# Altium integrated library RL2.IntLib: 663 symbols (part 3 of 4)
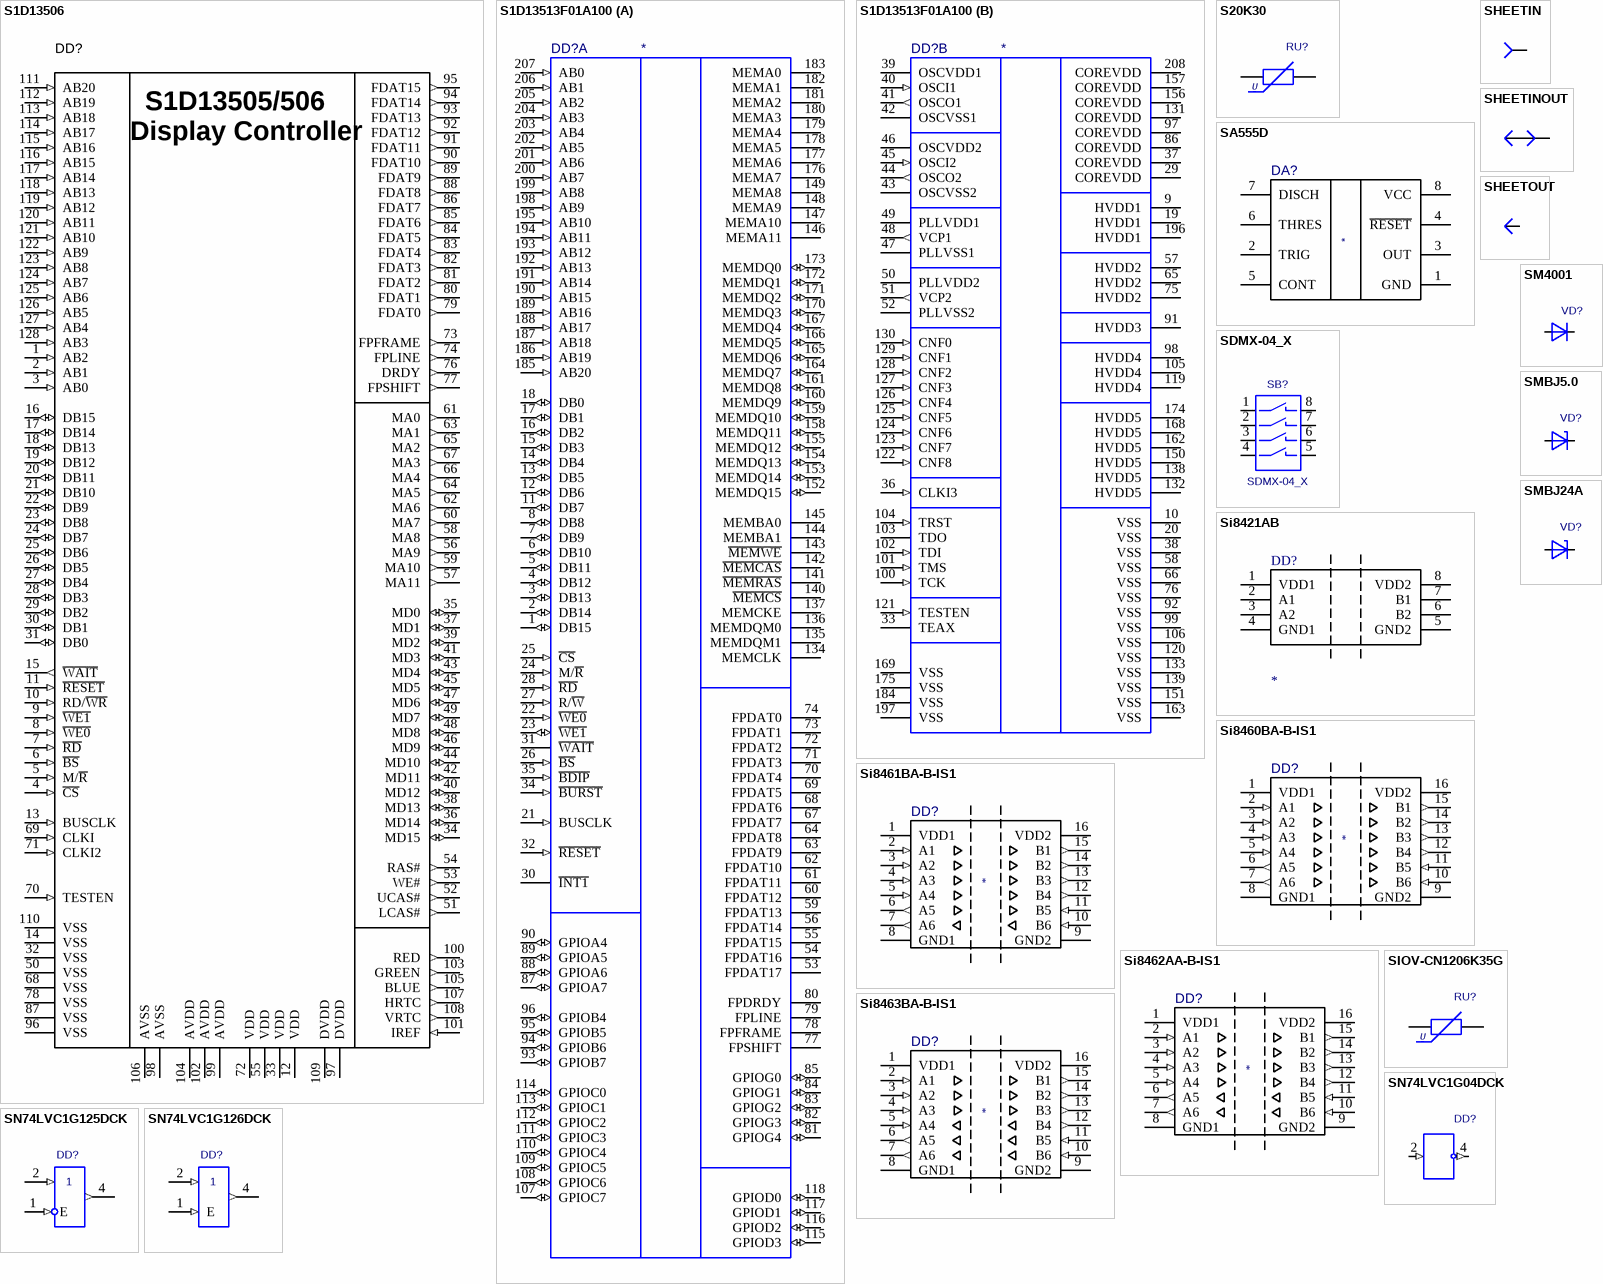
[diagram p36: symbols S1D13506 to SN74LVC1G126DCK]

## SIOV-CN1206K35G
designator RU?  (value not drawn)
SIOV-CN1206K35G; Value: {Value}
footprint SMD_1206
pins: 1, 2
text: U

## SM4001
designator VD?  (value not drawn)
SM4001; Value: *
footprint DO-213AB
pins: 1, 2

## SMBJ5.0
designator VD?  (value not drawn)
Value: *
footprint SMB
pins: 1, 2

## SMBJ24A
designator VD?, comment SMBJ5.0  (value not drawn)
Value: *
footprint SMB
pins: 1, 2

## SN74LVC1G04DCK
designator DD?  (value not drawn)
SN74LVC1G04DCK; Value: *
footprint SC-70
signal-integrity model Model Name (Model Description)
pins: 1 hidden, 2 (in), 3 GND (power) hidden, 4 (out), 5 VCC (power) hidden

## SN74LVC1G125DCK
designator DD?  (value not drawn)
SN74LVC1G125DCK; Value: *
footprint SC-70
pins: 1 E (in), 2 (in), 3 GND (power) hidden, 4 (out), 5 VCC (power) hidden

## SN74LVC1G126DCK
designator DD?  (value not drawn)
SN74LVC1G126DCK; Value: *
footprint SC-70
pins: 1 E (in), 2 (in), 3 GND (power) hidden, 4 (out), 5 VCC (power) hidden

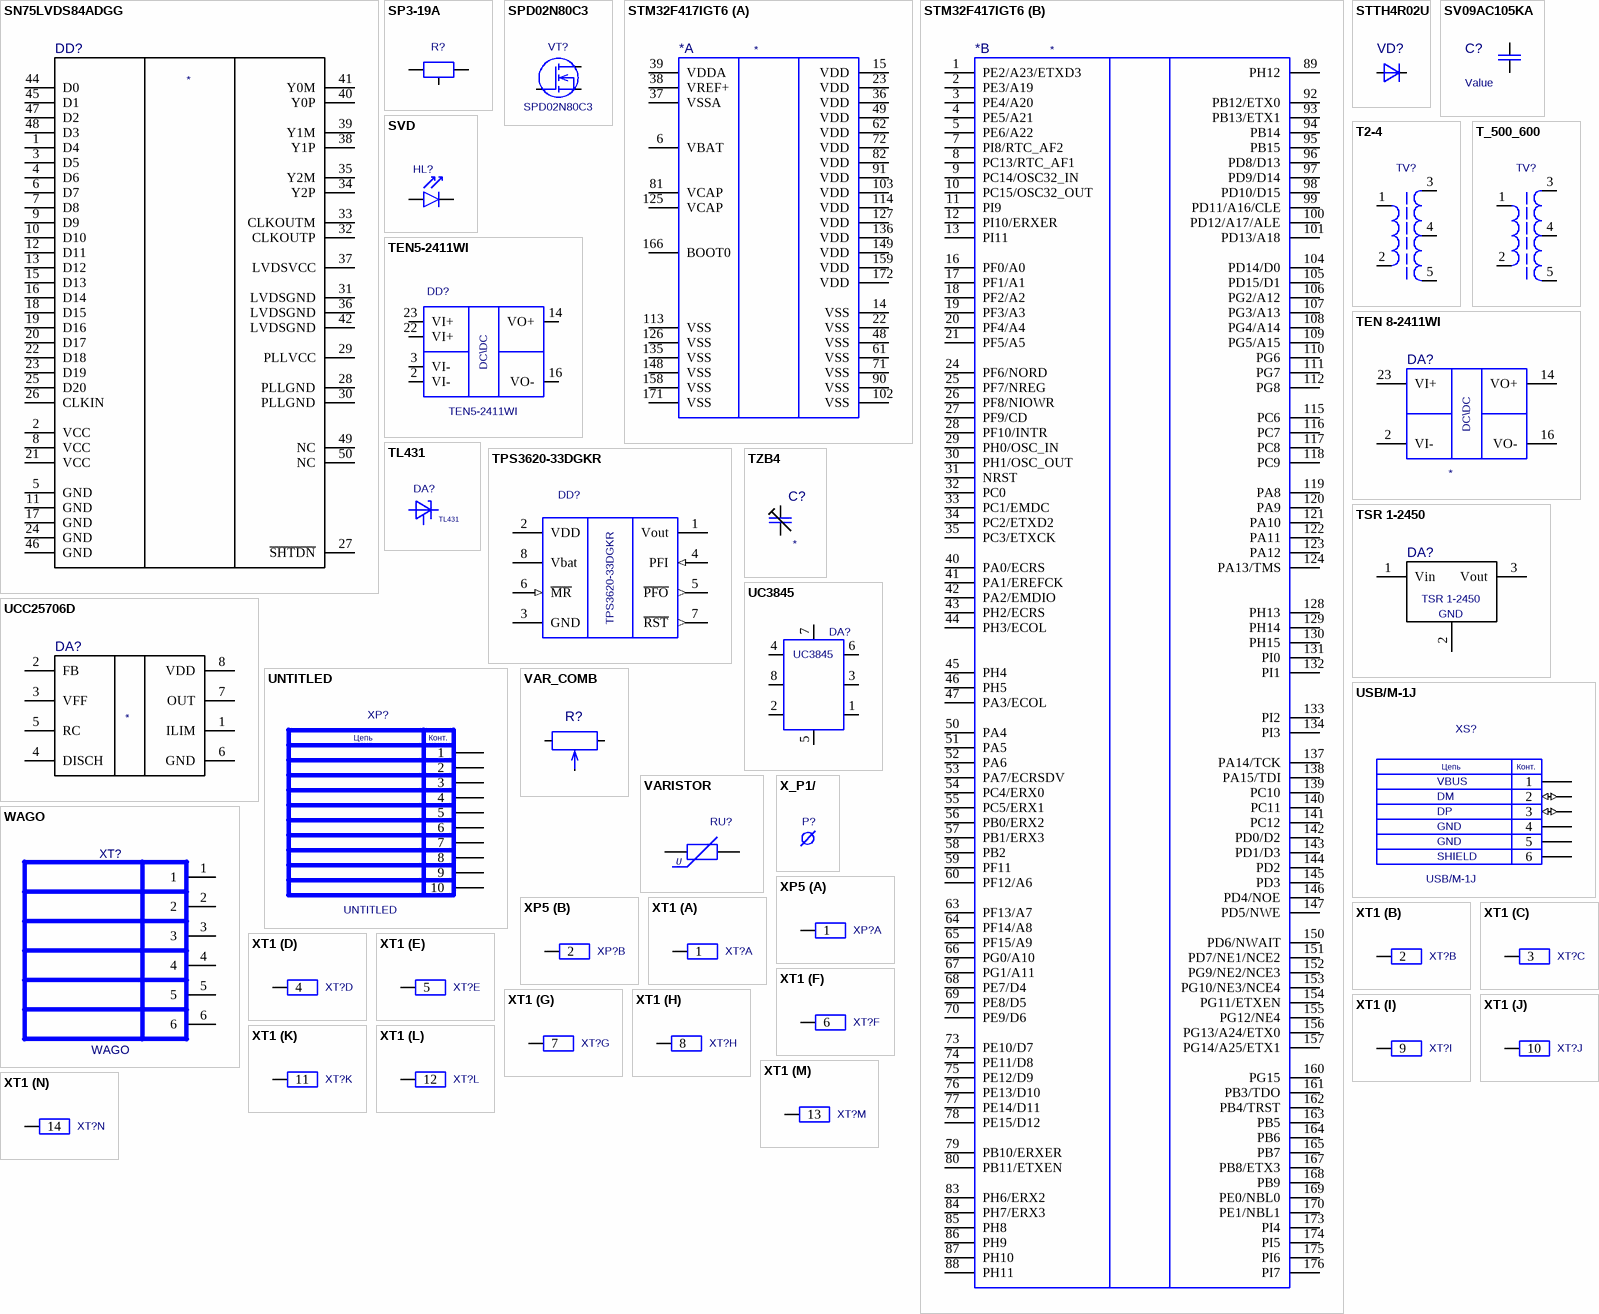
[diagram p18: symbols SN75LVDS84ADGG to XT1]

## SN75LVDS84ADGG
designator DD?
footprint TSSOP48 (JEDEC MO-153)
pins: 1 D4, 2 VCC, 3 D5, 4 D6, 5 GND, 6 D7, 7 D8, 8 VCC, 9 D9, 10 D10, 11 GND, 12 D11, 13 D12, 15 D13, 16 D14, 17 GND, 18 D15, 19 D16, 20 D17, 21 VCC, 22 D18, 23 D19, 24 GND, 25 D20, 26 CLKIN, 27 ~{SHTDN}, 28 PLLGND, 29 PLLVCC, 30 PLLGND, 31 LVDSGND, 32 CLKOUTP, 33 CLKOUTM, 34 Y2P, 35 Y2M, 36 LVDSGND, 37 LVDSVCC, 38 Y1P, 39 Y1M, 40 Y0P, 41 Y0M, 42 LVDSGND, 44 D0, 45 D1, 46 GND, 47 D2, 48 D3, 49 NC, 50 NC

## SP3-19A
designator R?  (value not drawn)
SP3-19A; PDIF_TY: 11107; Value: *
footprint SP3-19A
pins: 1 I/O1, 2 I/O2, 3 I/O3

## SPD02N80C3
designator VT?
MOSFET 800V 2A 2.7om; OriginalName: 2N4124; ComponentField6: Published 8-Jun-2000, Modified 11-July-2000: SIM Model Added.; Value: *
simulation model 2N4124
footprint D-PAK (TO-252)
pins: 1 G, 2 S, 3 D

## STM32F417IGT6
designator *
footprint LQFP176
part A pins: 6 VBAT, 14 VSS, 15 VDD, 22 VSS, 23 VDD, 36 VDD, 37 VSSA, 38 VREF+, 39 VDDA, 48 VSS, 49 VDD, 61 VSS, 62 VDD, 71 VSS, 72 VDD, 81 VCAP, 82 VDD, 90 VSS, 91 VDD, 102 VSS, 103 VDD, 113 VSS, 114 VDD, 125 VCAP, 126 VSS, 127 VDD, 135 VSS, 136 VDD, 148 VSS, 149 VDD, 158 VSS, 159 VDD, 166 BOOT0, 171 VSS, 172 VDD
part B pins: 1 PE2/A23/ETXD3, 2 PE3/A19, 3 PE4/A20, 4 PE5/A21, 5 PE6/A22, 7 PI8/RTC_AF2, 8 PC13/RTC_AF1, 9 PC14/OSC32_IN, 10 PC15/OSC32_OUT, 11 PI9, 12 PI10/ERXER, 13 PI11, 16 PF0/A0, 17 PF1/A1, 18 PF2/A2, 19 PF3/A3, 20 PF4/A4, 21 PF5/A5, 24 PF6/NORD, 25 PF7/NREG, 26 PF8/NIOWR, 27 PF9/CD, 28 PF10/INTR, 29 PH0/OSC_IN, 30 PH1/OSC_OUT, 31 NRST, 32 PC0, 33 PC1/EMDC, 34 PC2/ETXD2, 35 PC3/ETXCK, 40 PA0/ECRS, 41 PA1/EREFCK, 42 PA2/EMDIO, 43 PH2/ECRS, 44 PH3/ECOL, 45 PH4, 46 PH5, 47 PA3/ECOL, 50 PA4, 51 PA5, 52 PA6, 53 PA7/ECRSDV, 54 PC4/ERX0, 55 PC5/ERX1, 56 PB0/ERX2, 57 PB1/ERX3, 58 PB2, 59 PF11, 60 PF12/A6, 63 PF13/A7, 64 PF14/A8, 65 PF15/A9, 66 PG0/A10, 67 PG1/A11, 68 PE7/D4, 69 PE8/D5, 70 PE9/D6, 73 PE10/D7, 74 PE11/D8, 75 PE12/D9, 76 PE13/D10, 77 PE14/D11, 78 PE15/D12, 79 PB10/ERXER, 80 PB11/ETXEN, 83 PH6/ERX2, 84 PH7/ERX3, 85 PH8, 86 PH9, 87 PH10, 88 PH11, 89 PH12, 92 PB12/ETX0, 93 PB13/ETX1, 94 PB14, 95 PB15, 96 PD8/D13, 97 PD9/D14, 98 PD10/D15, 99 PD11/A16/CLE, 100 PD12/A17/ALE, 101 PD13/A18, 104 PD14/D0, 105 PD15/D1, 106 PG2/A12, 107 PG3/A13, 108 PG4/A14, 109 PG5/A15, 110 PG6, 111 PG7, 112 PG8, 115 PC6, 116 PC7, 117 PC8, 118 PC9, 119 PA8, 120 PA9, 121 PA10, 122 PA11, 123 PA12, 124 PA13/TMS, 128 PH13, 129 PH14, 130 PH15, 131 PI0, 132 PI1, 133 PI2, 134 PI3, 137 PA14/TCK, 138 PA15/TDI, 139 PC10, 140 PC11, 141 PC12, 142 PD0/D2, 143 PD1/D3, 144 PD2, 145 PD3, 146 PD4/NOE, 147 PD5/NWE, 150 PD6/NWAIT, 151 PD7/NE1/NCE2, 152 PG9/NE2/NCE3, 153 PG10/NE3/NCE4, 154 PG11/ETXEN, 155 PG12/NE4, 156 PG13/A24/ETX0, 157 PG14/A25/ETX1, 160 PG15, 161 PB3/TDO, 162 PB4/TRST, 163 PB5, 164 PB6, 165 PB7, 167 PB8/ETX3, 168 PB9, 169 PE0/NBL0, 170 PE1/NBL1, 173 PI4, 174 PI5, 175 PI6, 176 PI7

## STTH4R02U
designator VD?  (value not drawn)
footprint DO-214AA SMB
pins: 1, 2

## SV09AC105KA
designator C?  (value not drawn)
Value: Value
footprint SV09
pins: 1, 2

## SVD
designator HL?  (value not drawn)
SVD; Value: *
footprint KM2520
pins: 1 A, 2 C

## T2-4
designator TV?  (value not drawn)
T2-4; Value: *
footprint T2-4
pins: 1, 2 0, 3 0, 4 1, 5 2, 6 hidden

## T_500_600
designator TV?  (value not drawn)
T_500_600; Value: *
footprint T_500_600
pins: 1, 2, 3, 4, 5, 6 hidden

## TEN5-2411WI
designator DD?
Value: *
footprint TEN5-2411WI_TEN5-2411WI(Primary)
pins: 2 VI-, 3 VI-, 9 hidden, 11 hidden, 14 VO+, 16 VO-, 22 VI+, 23 VI+
text: DC\DC

## TEN 8-2411WI
designator DA?
TEN 8-2411WI; Value: *
footprint DC-DC DIP24_AM5TW-2405SZ(Primary)
pins: 2 VI-, 14 VO+, 16 VO-, 23 VI+
text: DC\DC

## TL431
designator DA?
Value: *
footprint KT26-1_TL431(KT26-1-1)
footprint KT26-1_TL431(Primary)
pins: A, G, K

## TPS3620-33DGKR
designator DD?
Value: *
footprint MSOP8
pins: 1 Vout (power), 2 VDD (power), 3 GND (power), 4 PFI (in), 5 ~{PFO} (out), 6 ~{MR} (in), 7 ~{RST} (out), 8 Vbat (power)

## TSR 1-2450
designator DA?
footprint DC-DC SIP3
pins: 1 Vin, 2, 3 Vout
text: GND

## TZB4
designator C?
footprint TZB4
pins: 1, 2

## UC3845
designator DA?
Value: *
footprint DIP8
pins: 1, 2, 3, 4, 5, 6, 7, 8

## UCC25706D
designator DA?
footprint SOIC8 JEDEC
pins: 1 ILIM, 2 FB, 3 VFF, 4 DISCH, 5 RC, 6 GND, 7 OUT, 8 VDD

## UNTITLED
designator XP?
Value: *
footprint IDC10M_MR
footprint IDC10M_Primary
pins: 1, 2, 3, 4, 5, 6, 7, 8, 9, 10
text: Цепь; Конт.

## USB/M-1J
designator XS?
розетка на плату miniUSB 5BFR SMD; Value: *
footprint USB_B_MINI
pins: 1 (power), 2 (io), 3 (io), 4 (power), 5 (power), 6 (power)
text: Цепь; Конт.; VBUS; DM; DP; GND; SHIELD

## VAR_COMB
designator R?  (value not drawn)
VAR_COMB; Value: *
footprint VAR_RES_COMB
pins: 1, 2, 3, 4 hidden, 5 hidden, 6 hidden

## VARISTOR
designator RU?  (value not drawn)
VARISTOR; Value: {Value}
footprint VARISTOR
pins: 1, 2
text: U

## WAGO
designator XT?
Value: *
footprint 737-652
pins: 1, 2, 3, 4, 5, 6

## X_P1/
designator P?  (value not drawn)
Card-Edge Connector; Value: *
footprint PIN
footprint PIN_R1.4_0.9
pins: 1 1A

## XP5
designator XP?  (value not drawn)
XP5; Value: *
footprint 8113S\2G
part A pins: 1 (power)
part B pins: 2 (power)

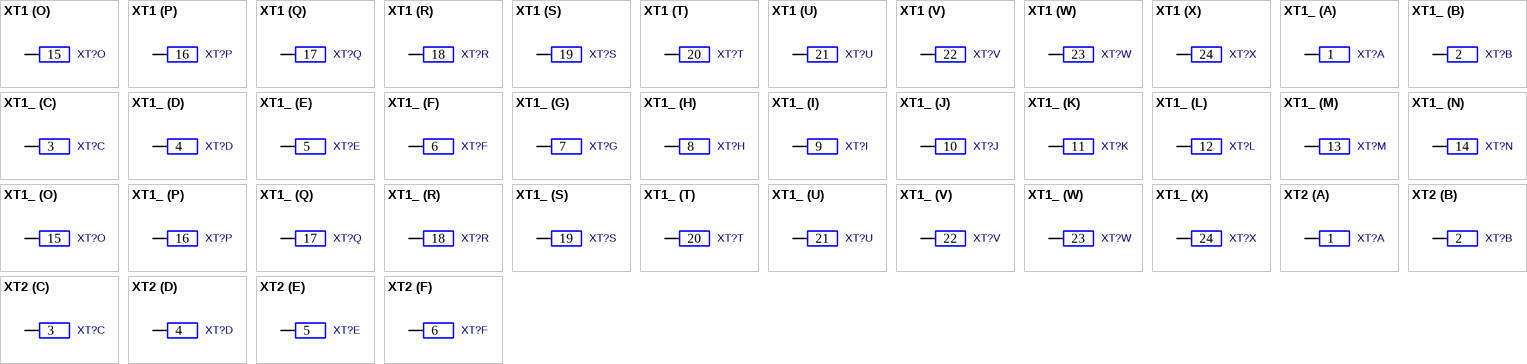
[diagram p19: symbols XT1 to XT2]

## XT1
designator XT?  (value not drawn)
XT1; Value: *
footprint XT1
part A pins: 1
part B pins: 2
part C pins: 3
part D pins: 4
part E pins: 5
part F pins: 6
part G pins: 7
part H pins: 8
part I pins: 9
part J pins: 10
part K pins: 11
part L pins: 12
part M pins: 13
part N pins: 14
part O pins: 15
part P pins: 16
part Q pins: 17
part R pins: 18
part S pins: 19
part T pins: 20
part U pins: 21
part V pins: 22
part W pins: 23
part X pins: 24

## XT1_
designator XT?  (value not drawn)
XT1_; Value: *
footprint XT1
part A pins: 1
part B pins: 2
part C pins: 3
part D pins: 4
part E pins: 5
part F pins: 6
part G pins: 7
part H pins: 8
part I pins: 9
part J pins: 10
part K pins: 11
part L pins: 12
part M pins: 13
part N pins: 14
part O pins: 15
part P pins: 16
part Q pins: 17
part R pins: 18
part S pins: 19
part T pins: 20
part U pins: 21
part V pins: 22
part W pins: 23
part X pins: 24

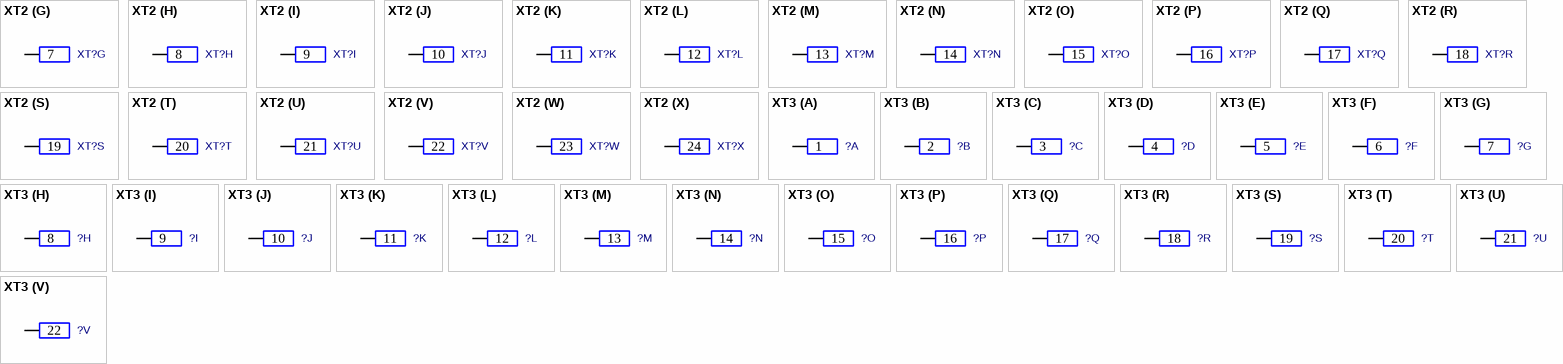
[diagram p20: symbols XT2 to XT3]

## XT2
designator XT?  (value not drawn)
XT2; Value: *
footprint XT1
part A pins: 1
part B pins: 2
part C pins: 3
part D pins: 4
part E pins: 5
part F pins: 6
part G pins: 7
part H pins: 8
part I pins: 9
part J pins: 10
part K pins: 11
part L pins: 12
part M pins: 13
part N pins: 14
part O pins: 15
part P pins: 16
part Q pins: 17
part R pins: 18
part S pins: 19
part T pins: 20
part U pins: 21
part V pins: 22
part W pins: 23
part X pins: 24

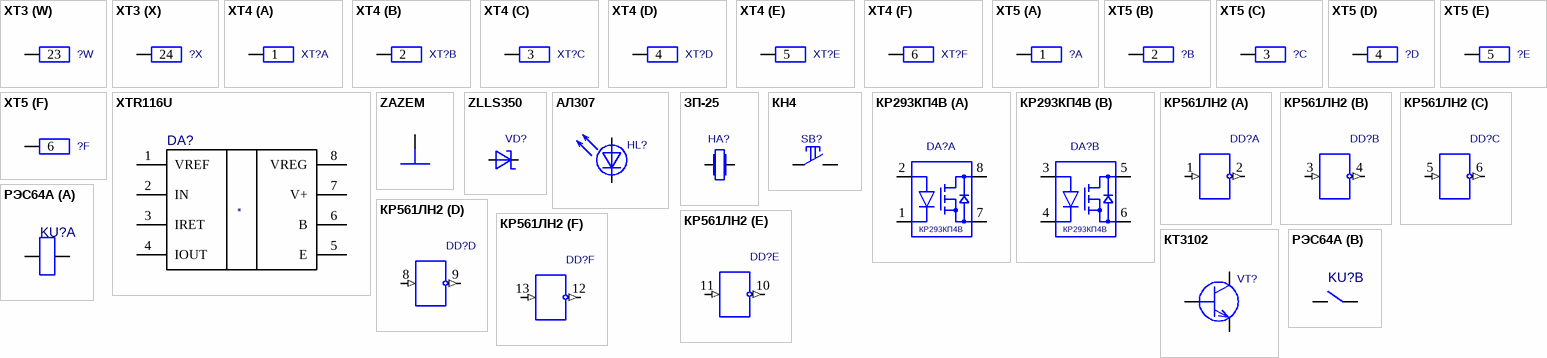
[diagram p21: symbols XT3 to РЭС64А]

## XT3
designator ?  (value not drawn)
XT3; Value: *
footprint XT3
part A pins: 1
part B pins: 2
part C pins: 3
part D pins: 4
part E pins: 5
part F pins: 6
part G pins: 7
part H pins: 8
part I pins: 9
part J pins: 10
part K pins: 11
part L pins: 12
part M pins: 13
part N pins: 14
part O pins: 15
part P pins: 16
part Q pins: 17
part R pins: 18
part S pins: 19
part T pins: 20
part U pins: 21
part V pins: 22
part W pins: 23
part X pins: 24

## XT4
designator XT?  (value not drawn)
XT4; Value: *
footprint 737-652_XT4(Primary)
part A pins: 1
part B pins: 2
part C pins: 3
part D pins: 4
part E pins: 5
part F pins: 6

## XT5
designator ?  (value not drawn)
XT5; Value: *
footprint 737-652
part A pins: 1
part B pins: 2
part C pins: 3
part D pins: 4
part E pins: 5
part F pins: 6

## XTR116U
designator DA?
footprint SOIC8 JEDEC
pins: 1 VREF, 2 IN, 3 IRET, 4 IOUT, 5 E, 6 B, 7 V+, 8 VREG

## ZAZEM
designator ?  (value not drawn)
Value: *
footprint ZAZEM
pins: 1 GND

## ZLLS350
designator VD?  (value not drawn)
ZLLS350; Value: *
footprint SOD-523 (Footprint not found)
pins: 1, 2

## АЛ307
designator HL?  (value not drawn)
АЛ307; Docum: аА0.336.076ТУ; Author: Sevastianov; Value: *
footprint КИ2-3_Primary
footprint КИ2-3_g
footprint КИ2-3_g+1
footprint КИ2-3_g+2
footprint КИ2-3_g-1
footprint КИ2-3_gg
pins: 1 A, 2 K

## ЗП-25
designator HA?  (value not drawn)
ЗП-25; Value: *
footprint ZP3
pins: 1, 2

## КН4
designator SB?  (value not drawn)
КН4; Value: *
footprint КН4_PAT
pins: 1, 2 hidden, 3, 4 hidden

## КР293КП4В
designator DA?
Value: *
footprint DIP-8
part A pins: 1, 2, 7, 8
part B pins: 3, 4, 5, 6

## КР561ЛН2
designator DD?  (value not drawn)
КР561ЛН2; Value: *
footprint DIP14_Primary
footprint DIP14_prim125
pins on every part: 7 GND (power) hidden, 14 VCC (power) hidden
part A pins: 1 (in), 2 (out)
part B pins: 3 (in), 4 (out)
part C pins: 5 (in), 6 (out)
part D pins: 8 (in), 9 (out)
part E pins: 10 (out), 11 (in)
part F pins: 12 (out), 13 (in)

## КТ3102
designator VT?  (value not drawn)
КТ3102; Value: *
footprint ТО-18
pins: 1, 2, 3

## РЭС64А
designator KU?  (value not drawn)
РЭС64А; Value: *
footprint РЭС64А
part A pins: А, Б
part B pins: 2, 3


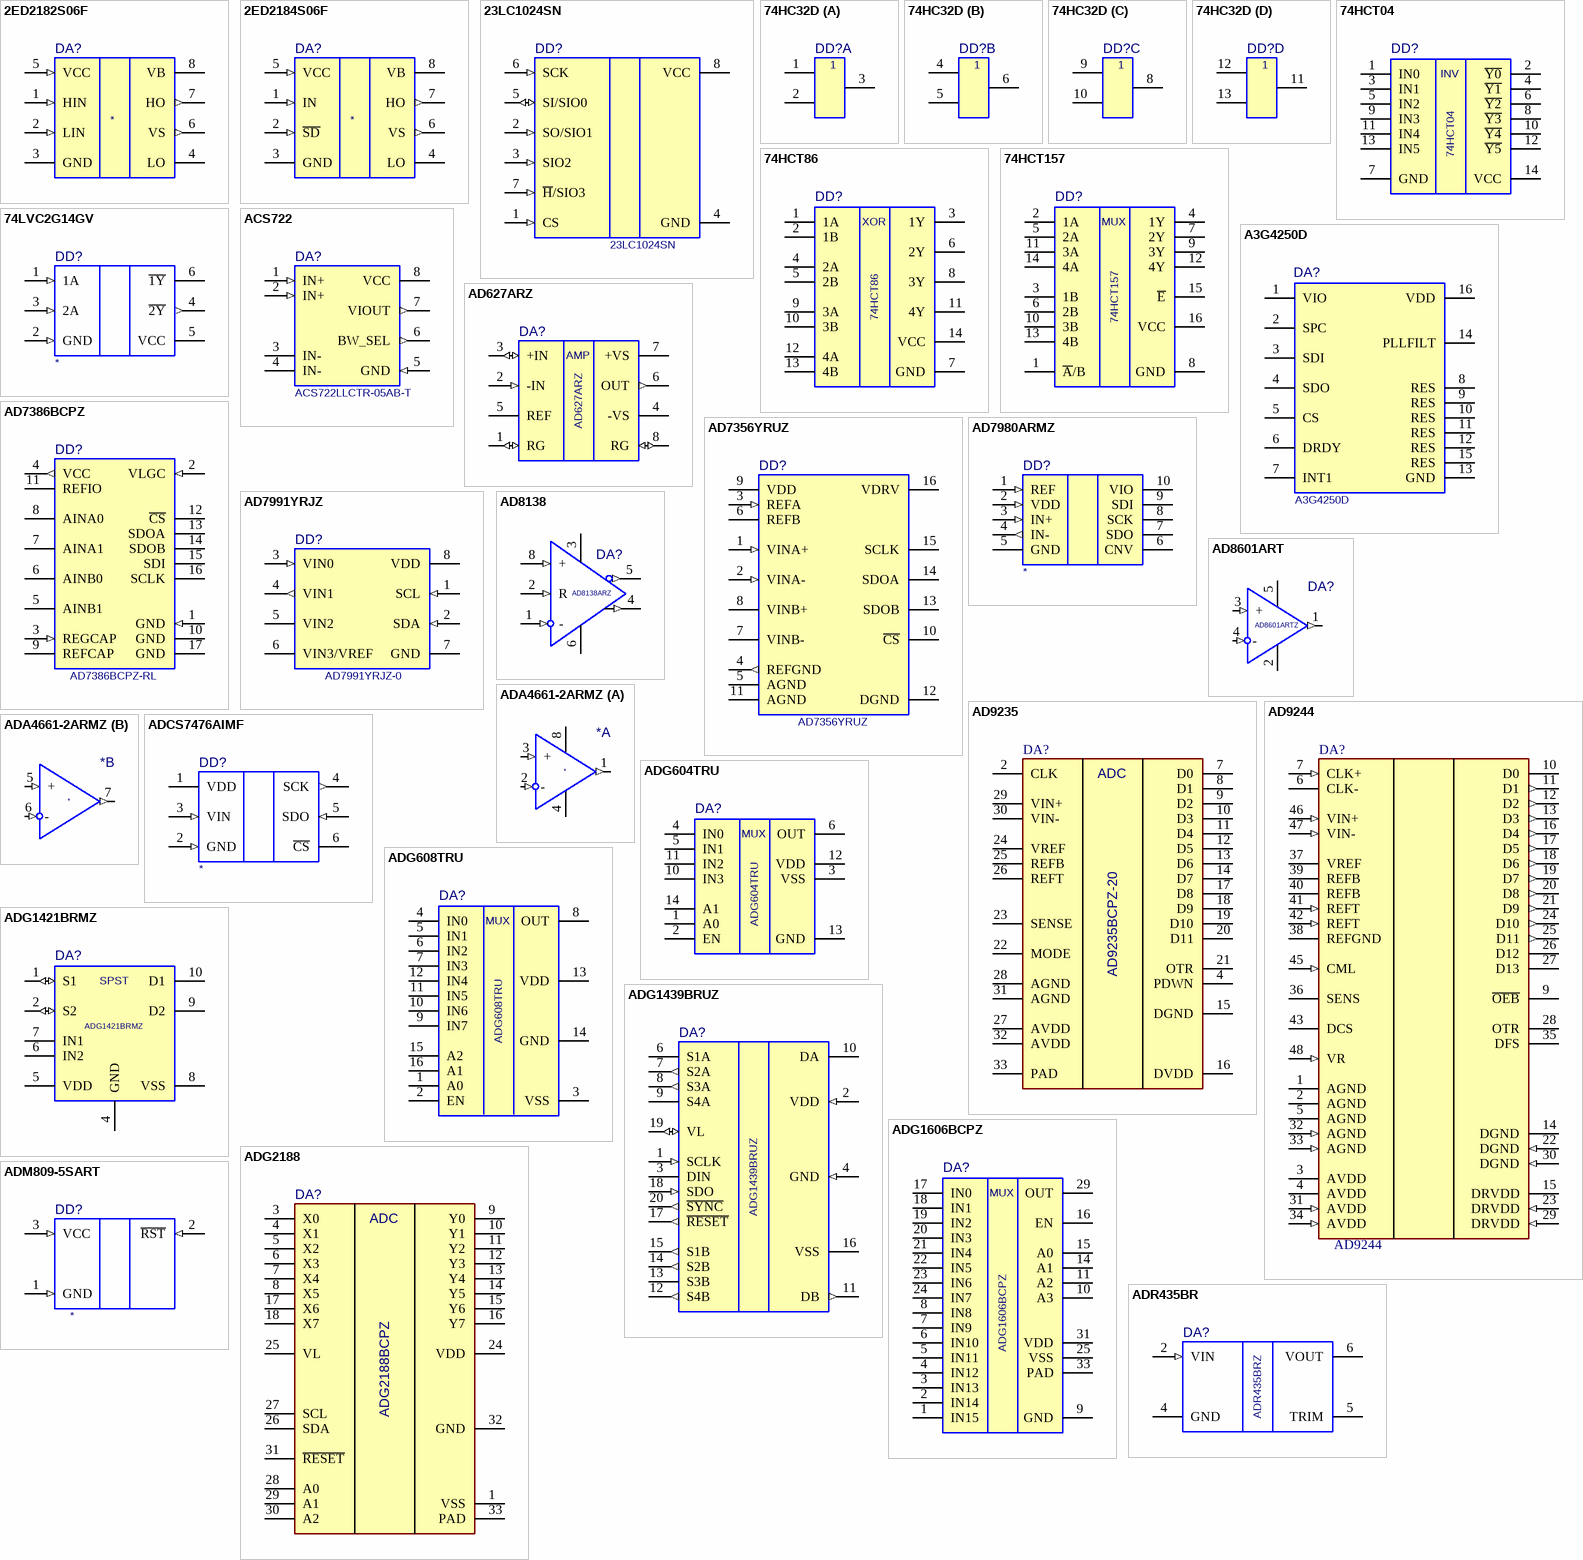
[diagram p22: symbols 2ED2182S06F to ADR435BR]

## 2ED2182S06F
designator DA?
footprint SOIC8 JEDEC
pins: 1 HIN (in), 2 LIN (in), 3 GND (power), 4 LO (power), 5 VCC (in), 6 VS (out), 7 HO (out), 8 VB (power)

## 2ED2184S06F
designator DA?
footprint SOIC8 JEDEC
pins: 1 IN (in), 2 ~{SD} (in), 3 GND (power), 4 LO (power), 5 VCC (in), 6 VS (out), 7 HO (out), 8 VB (power)

## 23LC1024SN
designator DD?
footprint SOIC8 JEDEC
signal-integrity model Model Name (Model Description)
pins: 1 CS (in), 2 SO/SIO1 (in), 3 SIO2 (in), 4 GND (power), 5 SI/SIO0 (io), 6 SCK (in), 7 ~{H}/SIO3 (in), 8 VCC (power)

## 74HC32D
designator DD?  (value not drawn)
footprint SOIC 14
pins on every part: 7 GND (power) hidden to GND, 14 VCC (power) hidden to VCC
part A pins: 1, 2, 3
part B pins: 4, 5, 6
part C pins: 8, 9, 10
part D pins: 11, 12, 13

## 74HCT04
designator DD?
Part Field 1: *; Part Field 2: *
footprint TSSOP14 (JEDEC MO-153)
pins: 1 IN0, 2 ~{Y0}, 3 IN1, 4 ~{Y1}, 5 IN2, 6 ~{Y2}, 7 GND, 8 ~{Y3}, 9 IN3, 10 ~{Y4}, 11 IN4, 12 ~{Y5}, 13 IN5, 14 VCC
text: INV

## 74HCT86
designator DD?
Part Field 1: *; Part Field 2: *
footprint TSSOP14 (JEDEC MO-153)
pins: 1 1A, 2 1B, 3 1Y, 4 2A, 5 2B, 6 2Y, 7 GND, 8 3Y, 9 3A, 10 3B, 11 4Y, 12 4A, 13 4B, 14 VCC
text: XOR

## 74HCT157
designator DD?
QUADRUPLE2-LINETO1-LINEDATASELECTORS/MULTIPLEXERS; Part Field 1: *; Part Field 2: *
footprint TSSOP16 (JEDEC MO-153)
pins: 1 ~{A}/B, 2 1A, 3 1B, 4 1Y, 5 2A, 6 2B, 7 2Y, 8 GND, 9 3Y, 10 3B, 11 3A, 12 4Y, 13 4B, 14 4A, 15 ~{E}, 16 VCC
text: MUX

## 74LVC2G14GV
designator DD?
footprint SOT23-6  (SOT457) (SC-74)
pins: 1 1A (in), 2 GND (in), 3 2A (in), 4 ~{2Y} (out), 5 VCC (power), 6 ~{1Y} (power)

## A3G4250D
designator DA?
3-axis digital output gyroscope; Part Field 1: *; Part Field 2: *
footprint LGA-16
pins: 1 VIO, 2 SPC, 3 SDI, 4 SDO, 5 CS, 6 DRDY, 7 INT1, 8 RES, 9 RES, 10 RES, 11 RES, 12 RES, 13 GND, 14 PLLFILT, 15 RES, 16 VDD

## ACS722
designator DA?, comment ACS722LLCTR-05AB-T
footprint SOIC8 JEDEC
pins: 1 IN+ (in), 2 IN+ (in), 3 IN- (power), 4 IN- (power), 5 GND (in), 6 BW_SEL (out), 7 VIOUT (out), 8 VCC (power)

## AD627ARZ
designator DA?
footprint SOIC8 JEDEC
pins: 1 RG (io), 2 -IN (in), 3 +IN (io), 4 -VS, 5 REF (power), 6 OUT (out), 7 +VS (power), 8 RG (io)
text: AMP

## AD7356YRUZ
designator DD?
Differential Input, Dual, Simultaneous Sampling, 5 MSPS, 12-Bit, SAR ADC
footprint TSSOP16 (JEDEC MO-153)
pins: 1 VINA+ (in), 2 VINA- (in), 3 REFA (in), 4 REFGND (out), 5 AGND (power), 6 REFB (power), 7 VINB- (power), 8 VINB+ (power), 9 VDD (power), 10 ~{CS} (power), 11 AGND (power), 12 DGND (power), 13 SDOB (power), 14 SDOA (power), 15 SCLK (power), 16 VDRV (power)

## AD7386BCPZ
designator DD?, comment AD7386BCPZ-RL
4-Channel, 4 MSPS, 16-Bit, Dual, Simultaneous Sampling SAR ADCs
footprint LFCSP16 (CP-16-45) MO-220-WEED-4
pins: 1 GND (in), 2 VLGC (in), 3 REGCAP (in), 4 VCC (out), 5 AINB1 (power), 6 AINB0 (power), 7 AINA1 (power), 8 AINA0 (power), 9 REFCAP (power), 10 GND (power), 11 REFIO (power), 12 ~{CS} (power), 13 SDOA (power), 14 SDOB (power), 15 SDI (power), 16 SCLK (power), 17 GND (power)

## AD7980ARMZ
designator DD?
16-Bit, 1 MSPS PulSAR ADC in MSOP/QFN
footprint MSOP10 (MO-187-BA)
pins: 1 REF (in), 2 VDD (in), 3 IN+ (in), 4 IN- (out), 5 GND (power), 6 CNV (power), 7 SDO (power), 8 SCK (power), 9 SDI (power), 10 VIO (power)

## AD7991YRJZ
designator DD?, comment AD7991YRJZ-0
4-Channel, 12-Bit ADC with I2C-Compatible Interface in 8-Lead SOT-23
footprint SOT23-8 (RJ-8)
pins: 1 SCL (in), 2 SDA (in), 3 VIN0 (in), 4 VIN1 (out), 5 VIN2 (power), 6 VIN3/VREF (power), 7 GND (power), 8 VDD (power)

## AD8138
designator DA?, comment AD8138ARZ
footprint SOIC8 JEDEC
pins: 1  - (in), 2 R (in), 3 V+ (power), 4 +OUT (out), 5 -OUT  (out), 6 V- (power), 8 + (in)

## AD8601ART
designator DA?, comment AD8601ARTZ
footprint SOT23-5
pins: 1 OUT (out), 2 V- (power), 3 + (in), 4 - (in), 5 V+ (power)

## AD9235
designator DA?, comment AD9235BCPZ-20
12-Bit, 20/40/65 MSPS 3 V A/D Converter
footprint LFCSP32 (CP-32-7) MO-220-WHHD
pins: 2 CLK, 4 PDWN, 7 D0, 8 D1, 9 D2, 10 D3, 11 D4, 12 D5, 13 D6, 14 D7, 15 DGND, 16 DVDD, 17 D8, 18 D9, 19 D10, 20 D11, 21 OTR, 22 MODE, 23 SENSE, 24 VREF, 25 REFB, 26 REFT, 27 AVDD, 28 AGND, 29 VIN+, 30 VIN-, 31 AGND, 32 AVDD, 33 PAD
text: ADC

## AD9244
designator DA?
Complete 14-Bit, 40 MSPS/65 MSPS A/D Converter
footprint LQFP48_VBH48A
pins: 1 AGND (power), 2 AGND (power), 3 AVDD (power), 4 AVDD (power), 5 AGND, 6 CLK- (power), 7 CLK+ (in), 9 ~{OEB}, 10 D0, 11 D1 (out), 12 D2 (out), 13 D3 (out), 14 DGND, 15 DRVDD, 16 D4 (out), 17 D5 (out), 18 D6 (out), 19 D7 (out), 20 D8 (out), 21 D9 (out), 22 DGND (in), 23 DRVDD (in), 24 D10 (out), 25 D11 (out), 26 D12, 27 D13, 28 OTR (power), 29 DRVDD (in), 30 DGND (in), 31 AVDD (in), 32 AGND (in), 33 AGND (in), 34 AVDD (in), 35 DFS, 36 SENS, 37 VREF, 38 REFGND, 39 REFB (power), 40 REFB, 41 REFT (in), 42 REFT (in), 43 DCS, 45 CML (in), 46 VIN+ (in), 47 VIN- (in), 48 VR (in)